# Altium integrated library Lattice CPLD ispLSI.IntLib: 471 symbols (part 10 of 26) (continued)
## ispLSI2128A-80LT176 (continued)
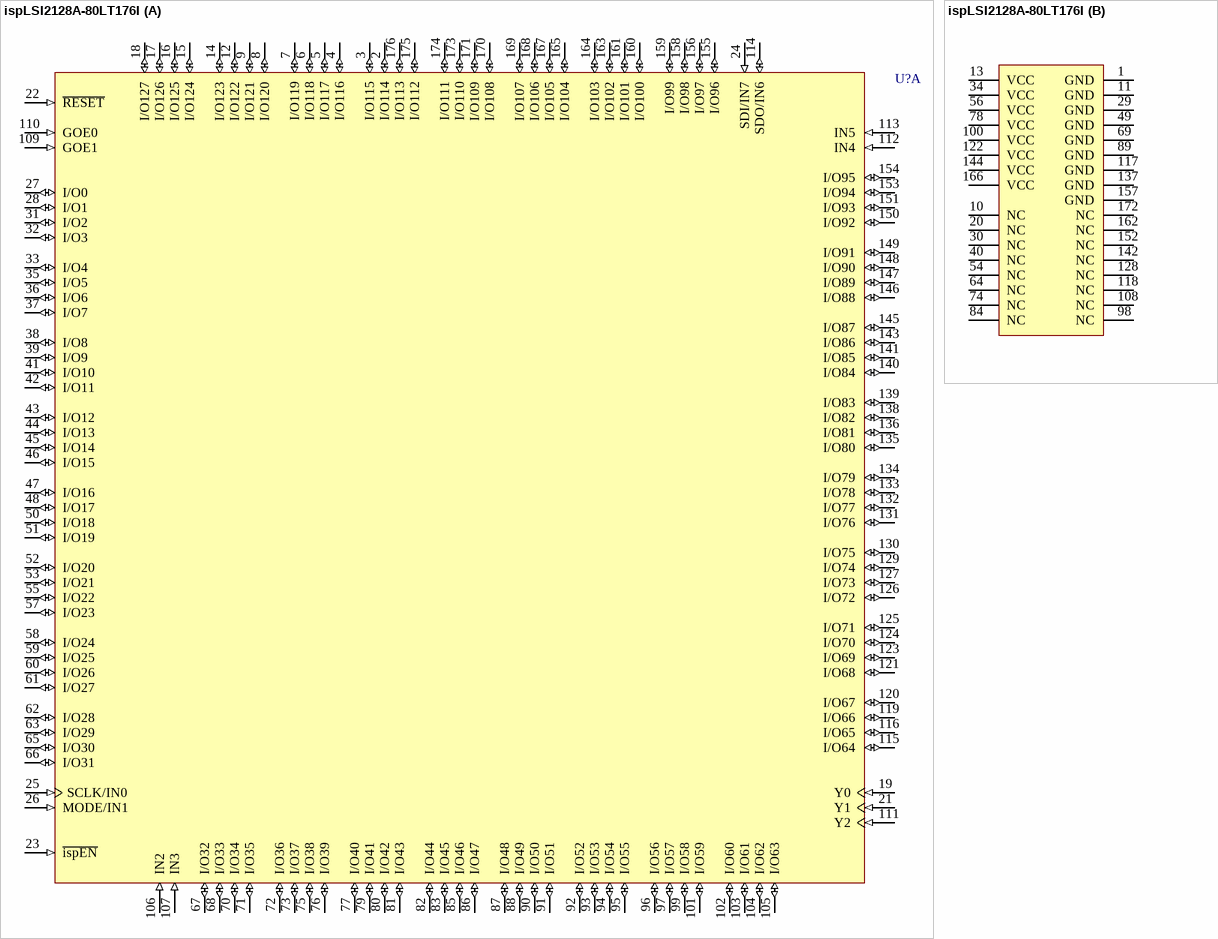
[diagram p82: symbol ispLSI2128A-80LT176I]

## ispLSI2128A-80LT176I
designator U?
In-System Programmable High-Density PLD; Note: Pins 24, 25, 26 and 114 have dual function capability.; Published: 23-Sep-2002; LatestRevisionDate: 13-Apr-2006; LatestRevisionNote: IPC-7351 Footprint Added.; DatasheetVersion: Apr-2000; PackageVersion: pkg_32, Aug-2005; PackageReference: TQFP176; Publisher: Altium Limited; PackageDescription: 176-Pin Thin Quad Flat Pack 0.5 mm Pitch; ComponentLink1Description: Manufacturer Link; ComponentLink1URL: http://www.latticesemi.com/products/mature/index.cfm; ComponentLink2Description: Datasheet; ComponentLink2URL: http://www.latticesemi.com/lit/docs/datasheets/cpld/2128.pdf
footprint TQFP176_N (Thin QFP, 176-Leads, Body 24x24mm, Pitch 0.5mm, IPC Medium Density)
footprint TQFP176_L (Thin QFP, 176-Leads, Body 24x24mm, Pitch 0.5mm, IPC High Density)
footprint TQFP176_M (Thin QFP, 176-Leads, Body 24x24mm, Pitch 0.5mm, IPC Low Density)
3D model 2128A-TQFP176 (176-Pin Thin Quad Flat Pack 0.5 mm Pitch)
part A pins: 2 I/O114 (io), 3 I/O115 (io), 4 I/O116 (io), 5 I/O117 (io), 6 I/O118 (io), 7 I/O119 (io), 8 I/O120 (io), 9 I/O121 (io), 12 I/O122 (io), 14 I/O123 (io), 15 I/O124 (io), 16 I/O125 (io), 17 I/O126 (io), 18 I/O127 (io), 19 Y0 (in), 21 Y1 (in), 22 ~{RESET} (in), 23 ~{ispEN} (in), 24 SDI/IN7 (in), 25 SCLK/IN0 (in), 26 MODE/IN1 (in), 27 I/O0 (io), 28 I/O1 (io), 31 I/O2 (io), 32 I/O3 (io), 33 I/O4 (io), 35 I/O5 (io), 36 I/O6 (io), 37 I/O7 (io), 38 I/O8 (io), 39 I/O9 (io), 41 I/O10 (io), 42 I/O11 (io), 43 I/O12 (io), 44 I/O13 (io), 45 I/O14 (io), 46 I/O15 (io), 47 I/O16 (io), 48 I/O17 (io), 50 I/O18 (io), 51 I/O19 (io), 52 I/O20 (io), 53 I/O21 (io), 55 I/O22 (io), 57 I/O23 (io), 58 I/O24 (io), 59 I/O25 (io), 60 I/O26 (io), 61 I/O27 (io), 62 I/O28 (io), 63 I/O29 (io), 65 I/O30 (io), 66 I/O31 (io), 67 I/O32 (io), 68 I/O33 (io), 70 I/O34 (io), 71 I/O35 (io), 72 I/O36 (io), 73 I/O37 (io), 75 I/O38 (io), 76 I/O39 (io), 77 I/O40 (io), 79 I/O41 (io), 80 I/O42 (io), 81 I/O43 (io), 82 I/O44 (io), 83 I/O45 (io), 85 I/O46 (io), 86 I/O47 (io), 87 I/O48 (io), 88 I/O49 (io), 90 I/O50 (io), 91 I/O51 (io), 92 I/O52 (io), 93 I/O53 (io), 94 I/O54 (io), 95 I/O55 (io), 96 I/O56 (io), 97 I/O57 (io), 99 I/O58 (io), 101 I/O59 (io), 102 I/O60 (io), 103 I/O61 (io), 104 I/O62 (io), 105 I/O63 (io), 106 IN2 (in), 107 IN3 (in), 109 GOE1 (in), 110 GOE0 (in), 111 Y2 (in), 112 IN4 (in), 113 IN5 (in), 114 SDO/IN6 (io), 115 I/O64 (io), 116 I/O65 (io), 119 I/O66 (io), 120 I/O67 (io), 121 I/O68 (io), 123 I/O69 (io), 124 I/O70 (io), 125 I/O71 (io), 126 I/O72 (io), 127 I/O73 (io), 129 I/O74 (io), 130 I/O75 (io), 131 I/O76 (io), 132 I/O77 (io), 133 I/O78 (io), 134 I/O79 (io), 135 I/O80 (io), 136 I/O81 (io), 138 I/O82 (io), 139 I/O83 (io), 140 I/O84 (io), 141 I/O85 (io), 143 I/O86 (io), 145 I/O87 (io), 146 I/O88 (io), 147 I/O89 (io), 148 I/O90 (io), 149 I/O91 (io), 150 I/O92 (io), 151 I/O93 (io), 153 I/O94 (io), 154 I/O95 (io), 155 I/O96 (io), 156 I/O97 (io), 158 I/O98 (io), 159 I/O99 (io), 160 I/O100 (io), 161 I/O101 (io), 163 I/O102 (io), 164 I/O103 (io), 165 I/O104 (io), 167 I/O105 (io), 168 I/O106 (io), 169 I/O107 (io), 170 I/O108 (io), 171 I/O109 (io), 173 I/O110 (io), 174 I/O111 (io), 175 I/O112 (io), 176 I/O113 (io)
part B pins: 1 GND (power), 10 NC, 11 GND (power), 13 VCC (power), 20 NC, 29 GND (power), 30 NC, 34 VCC (power), 40 NC, 49 GND (power), 54 NC, 56 VCC (power), 64 NC, 69 GND (power), 74 NC, 78 VCC (power), 84 NC, 89 GND (power), 98 NC, 100 VCC (power), 108 NC, 117 GND (power), 118 NC, 122 VCC (power), 128 NC, 137 GND (power), 142 NC, 144 VCC (power), 152 NC, 157 GND (power), 162 NC, 166 VCC (power), 172 NC

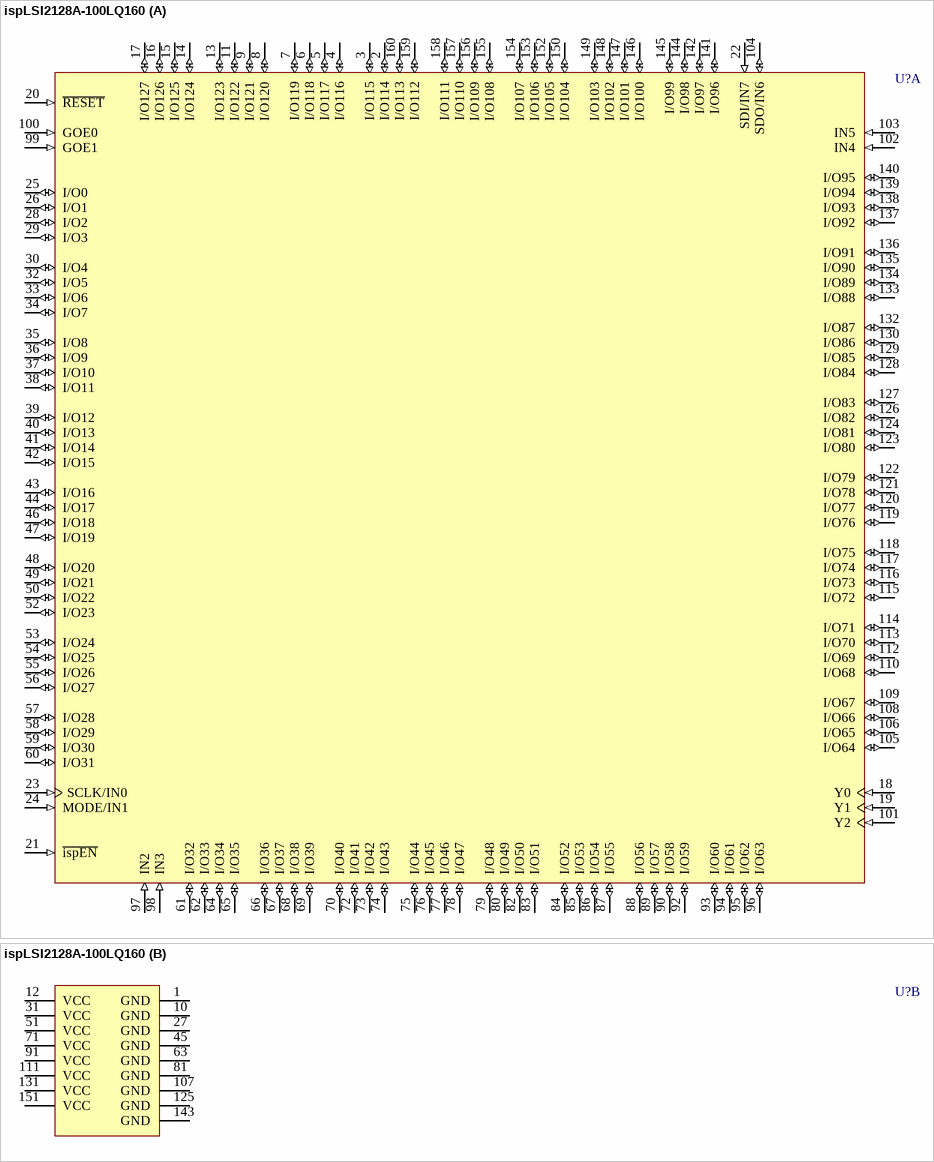
[diagram p83: symbol ispLSI2128A-100LQ160]

## ispLSI2128A-100LQ160
designator U?
In-System Programmable High-Density PLD; Note: Pins 22, 23, 24 and 104 have dual function capability.; Published: 23-Sep-2002; LatestRevisionDate: 13-Apr-2006; LatestRevisionNote: IPC-7351 Footprint Added.; DatasheetVersion: Apr-2000; PackageVersion: pkg_32, Aug-2005; PackageReference: PQFP160; Publisher: Altium Limited; PackageDescription: 160-Pin Quad Flat Pack 0.65 mm Pitch; Code_IPC: QFP65P3120X3120-160; ComponentLink1Description: Manufacturer Link; ComponentLink1URL: http://www.latticesemi.com/products/mature/index.cfm; ComponentLink2Description: Datasheet; ComponentLink2URL: http://www.latticesemi.com/lit/docs/datasheets/cpld/2128.pdf
footprint PQFP160_N (QFP, 160-Leads, Body 28 x 28mm, Pitch 0.65mm, IPC Medium Density)
footprint PQFP160_L (QFP, 160-Leads, Body 28 x 28mm, Pitch 0.65mm, IPC High Density)
footprint PQFP160_M (QFP, 160-Leads, Body 28 x 28mm, Pitch 0.65mm, IPC Low Density)
3D model 2128A-PQFP160 (160-Pin Quad Flat Pack 0.65 mm Pitch)
part A pins: 2 I/O114 (io), 3 I/O115 (io), 4 I/O116 (io), 5 I/O117 (io), 6 I/O118 (io), 7 I/O119 (io), 8 I/O120 (io), 9 I/O121 (io), 11 I/O122 (io), 13 I/O123 (io), 14 I/O124 (io), 15 I/O125 (io), 16 I/O126 (io), 17 I/O127 (io), 18 Y0 (in), 19 Y1 (in), 20 ~{RESET} (in), 21 ~{ispEN} (in), 22 SDI/IN7 (in), 23 SCLK/IN0 (in), 24 MODE/IN1 (in), 25 I/O0 (io), 26 I/O1 (io), 28 I/O2 (io), 29 I/O3 (io), 30 I/O4 (io), 32 I/O5 (io), 33 I/O6 (io), 34 I/O7 (io), 35 I/O8 (io), 36 I/O9 (io), 37 I/O10 (io), 38 I/O11 (io), 39 I/O12 (io), 40 I/O13 (io), 41 I/O14 (io), 42 I/O15 (io), 43 I/O16 (io), 44 I/O17 (io), 46 I/O18 (io), 47 I/O19 (io), 48 I/O20 (io), 49 I/O21 (io), 50 I/O22 (io), 52 I/O23 (io), 53 I/O24 (io), 54 I/O25 (io), 55 I/O26 (io), 56 I/O27 (io), 57 I/O28 (io), 58 I/O29 (io), 59 I/O30 (io), 60 I/O31 (io), 61 I/O32 (io), 62 I/O33 (io), 64 I/O34 (io), 65 I/O35 (io), 66 I/O36 (io), 67 I/O37 (io), 68 I/O38 (io), 69 I/O39 (io), 70 I/O40 (io), 72 I/O41 (io), 73 I/O42 (io), 74 I/O43 (io), 75 I/O44 (io), 76 I/O45 (io), 77 I/O46 (io), 78 I/O47 (io), 79 I/O48 (io), 80 I/O49 (io), 82 I/O50 (io), 83 I/O51 (io), 84 I/O52 (io), 85 I/O53 (io), 86 I/O54 (io), 87 I/O55 (io), 88 I/O56 (io), 89 I/O57 (io), 90 I/O58 (io), 92 I/O59 (io), 93 I/O60 (io), 94 I/O61 (io), 95 I/O62 (io), 96 I/O63 (io), 97 IN2 (in), 98 IN3 (in), 99 GOE1 (in), 100 GOE0 (in), 101 Y2 (in), 102 IN4 (in), 103 IN5 (in), 104 SDO/IN6 (io), 105 I/O64 (io), 106 I/O65 (io), 108 I/O66 (io), 109 I/O67 (io), 110 I/O68 (io), 112 I/O69 (io), 113 I/O70 (io), 114 I/O71 (io), 115 I/O72 (io), 116 I/O73 (io), 117 I/O74 (io), 118 I/O75 (io), 119 I/O76 (io), 120 I/O77 (io), 121 I/O78 (io), 122 I/O79 (io), 123 I/O80 (io), 124 I/O81 (io), 126 I/O82 (io), 127 I/O83 (io), 128 I/O84 (io), 129 I/O85 (io), 130 I/O86 (io), 132 I/O87 (io), 133 I/O88 (io), 134 I/O89 (io), 135 I/O90 (io), 136 I/O91 (io), 137 I/O92 (io), 138 I/O93 (io), 139 I/O94 (io), 140 I/O95 (io), 141 I/O96 (io), 142 I/O97 (io), 144 I/O98 (io), 145 I/O99 (io), 146 I/O100 (io), 147 I/O101 (io), 148 I/O102 (io), 149 I/O103 (io), 150 I/O104 (io), 152 I/O105 (io), 153 I/O106 (io), 154 I/O107 (io), 155 I/O108 (io), 156 I/O109 (io), 157 I/O110 (io), 158 I/O111 (io), 159 I/O112 (io), 160 I/O113 (io)
part B pins: 1 GND (power), 10 GND (power), 12 VCC (power), 27 GND (power), 31 VCC (power), 45 GND (power), 51 VCC (power), 63 GND (power), 71 VCC (power), 81 GND (power), 91 VCC (power), 107 GND (power), 111 VCC (power), 125 GND (power), 131 VCC (power), 143 GND (power), 151 VCC (power)

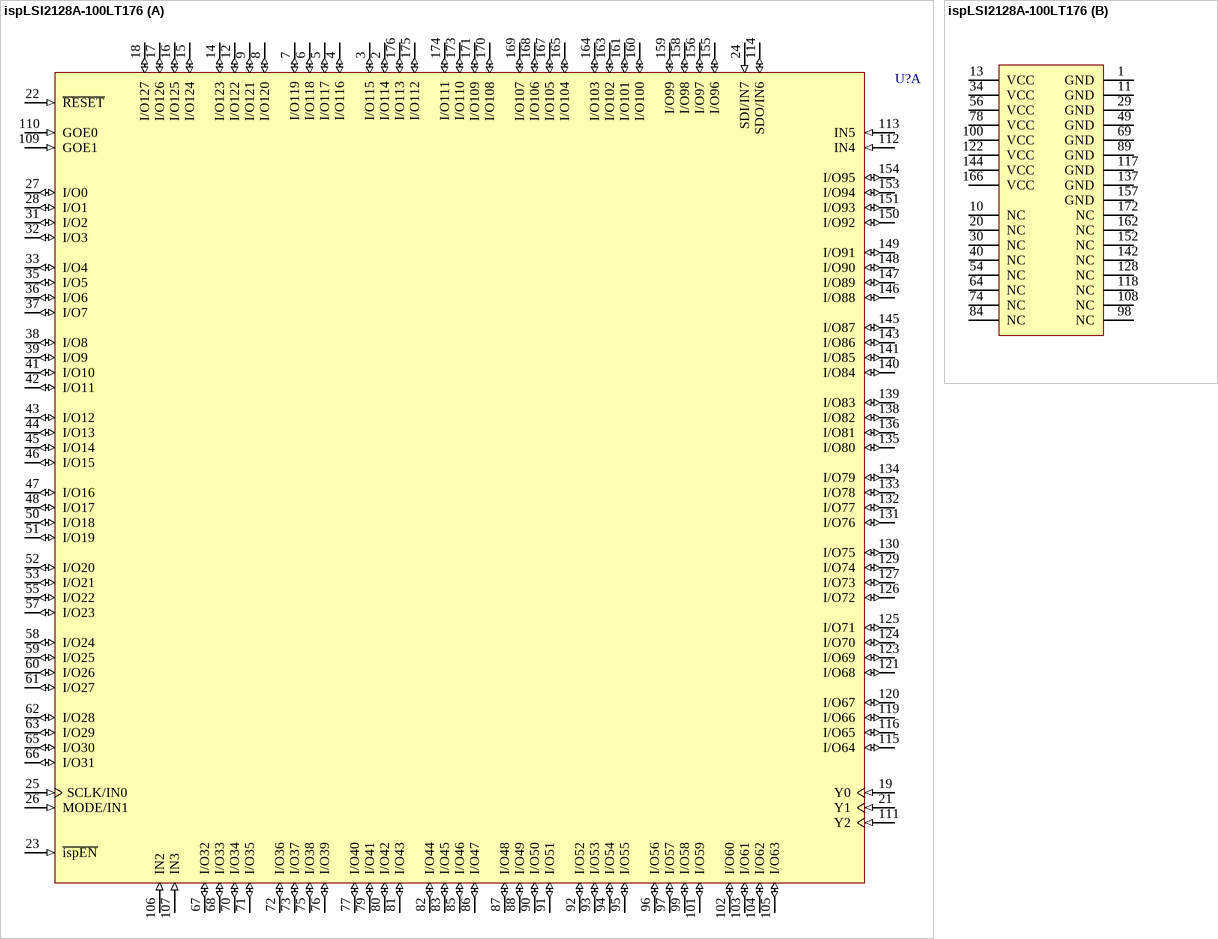
[diagram p84: symbol ispLSI2128A-100LT176]

## ispLSI2128A-100LT176
designator U?
In-System Programmable High-Density PLD; Note: Pins 24, 25, 26 and 114 have dual function capability.; Published: 23-Sep-2002; LatestRevisionDate: 13-Apr-2006; LatestRevisionNote: IPC-7351 Footprint Added.; DatasheetVersion: Apr-2000; PackageVersion: pkg_32, Aug-2005; PackageReference: TQFP176; Publisher: Altium Limited; PackageDescription: 176-Pin Thin Quad Flat Pack 0.5 mm Pitch; ComponentLink1Description: Manufacturer Link; ComponentLink1URL: http://www.latticesemi.com/products/mature/index.cfm; ComponentLink2Description: Datasheet; ComponentLink2URL: http://www.latticesemi.com/lit/docs/datasheets/cpld/2128.pdf
footprint TQFP176_N (Thin QFP, 176-Leads, Body 24x24mm, Pitch 0.5mm, IPC Medium Density)
footprint TQFP176_L (Thin QFP, 176-Leads, Body 24x24mm, Pitch 0.5mm, IPC High Density)
footprint TQFP176_M (Thin QFP, 176-Leads, Body 24x24mm, Pitch 0.5mm, IPC Low Density)
3D model 2128A-TQFP176 (176-Pin Thin Quad Flat Pack 0.5 mm Pitch)
part A pins: 2 I/O114 (io), 3 I/O115 (io), 4 I/O116 (io), 5 I/O117 (io), 6 I/O118 (io), 7 I/O119 (io), 8 I/O120 (io), 9 I/O121 (io), 12 I/O122 (io), 14 I/O123 (io), 15 I/O124 (io), 16 I/O125 (io), 17 I/O126 (io), 18 I/O127 (io), 19 Y0 (in), 21 Y1 (in), 22 ~{RESET} (in), 23 ~{ispEN} (in), 24 SDI/IN7 (in), 25 SCLK/IN0 (in), 26 MODE/IN1 (in), 27 I/O0 (io), 28 I/O1 (io), 31 I/O2 (io), 32 I/O3 (io), 33 I/O4 (io), 35 I/O5 (io), 36 I/O6 (io), 37 I/O7 (io), 38 I/O8 (io), 39 I/O9 (io), 41 I/O10 (io), 42 I/O11 (io), 43 I/O12 (io), 44 I/O13 (io), 45 I/O14 (io), 46 I/O15 (io), 47 I/O16 (io), 48 I/O17 (io), 50 I/O18 (io), 51 I/O19 (io), 52 I/O20 (io), 53 I/O21 (io), 55 I/O22 (io), 57 I/O23 (io), 58 I/O24 (io), 59 I/O25 (io), 60 I/O26 (io), 61 I/O27 (io), 62 I/O28 (io), 63 I/O29 (io), 65 I/O30 (io), 66 I/O31 (io), 67 I/O32 (io), 68 I/O33 (io), 70 I/O34 (io), 71 I/O35 (io), 72 I/O36 (io), 73 I/O37 (io), 75 I/O38 (io), 76 I/O39 (io), 77 I/O40 (io), 79 I/O41 (io), 80 I/O42 (io), 81 I/O43 (io), 82 I/O44 (io), 83 I/O45 (io), 85 I/O46 (io), 86 I/O47 (io), 87 I/O48 (io), 88 I/O49 (io), 90 I/O50 (io), 91 I/O51 (io), 92 I/O52 (io), 93 I/O53 (io), 94 I/O54 (io), 95 I/O55 (io), 96 I/O56 (io), 97 I/O57 (io), 99 I/O58 (io), 101 I/O59 (io), 102 I/O60 (io), 103 I/O61 (io), 104 I/O62 (io), 105 I/O63 (io), 106 IN2 (in), 107 IN3 (in), 109 GOE1 (in), 110 GOE0 (in), 111 Y2 (in), 112 IN4 (in), 113 IN5 (in), 114 SDO/IN6 (io), 115 I/O64 (io), 116 I/O65 (io), 119 I/O66 (io), 120 I/O67 (io), 121 I/O68 (io), 123 I/O69 (io), 124 I/O70 (io), 125 I/O71 (io), 126 I/O72 (io), 127 I/O73 (io), 129 I/O74 (io), 130 I/O75 (io), 131 I/O76 (io), 132 I/O77 (io), 133 I/O78 (io), 134 I/O79 (io), 135 I/O80 (io), 136 I/O81 (io), 138 I/O82 (io), 139 I/O83 (io), 140 I/O84 (io), 141 I/O85 (io), 143 I/O86 (io), 145 I/O87 (io), 146 I/O88 (io), 147 I/O89 (io), 148 I/O90 (io), 149 I/O91 (io), 150 I/O92 (io), 151 I/O93 (io), 153 I/O94 (io), 154 I/O95 (io), 155 I/O96 (io), 156 I/O97 (io), 158 I/O98 (io), 159 I/O99 (io), 160 I/O100 (io), 161 I/O101 (io), 163 I/O102 (io), 164 I/O103 (io), 165 I/O104 (io), 167 I/O105 (io), 168 I/O106 (io), 169 I/O107 (io), 170 I/O108 (io), 171 I/O109 (io), 173 I/O110 (io), 174 I/O111 (io), 175 I/O112 (io), 176 I/O113 (io)
part B pins: 1 GND (power), 10 NC, 11 GND (power), 13 VCC (power), 20 NC, 29 GND (power), 30 NC, 34 VCC (power), 40 NC, 49 GND (power), 54 NC, 56 VCC (power), 64 NC, 69 GND (power), 74 NC, 78 VCC (power), 84 NC, 89 GND (power), 98 NC, 100 VCC (power), 108 NC, 117 GND (power), 118 NC, 122 VCC (power), 128 NC, 137 GND (power), 142 NC, 144 VCC (power), 152 NC, 157 GND (power), 162 NC, 166 VCC (power), 172 NC

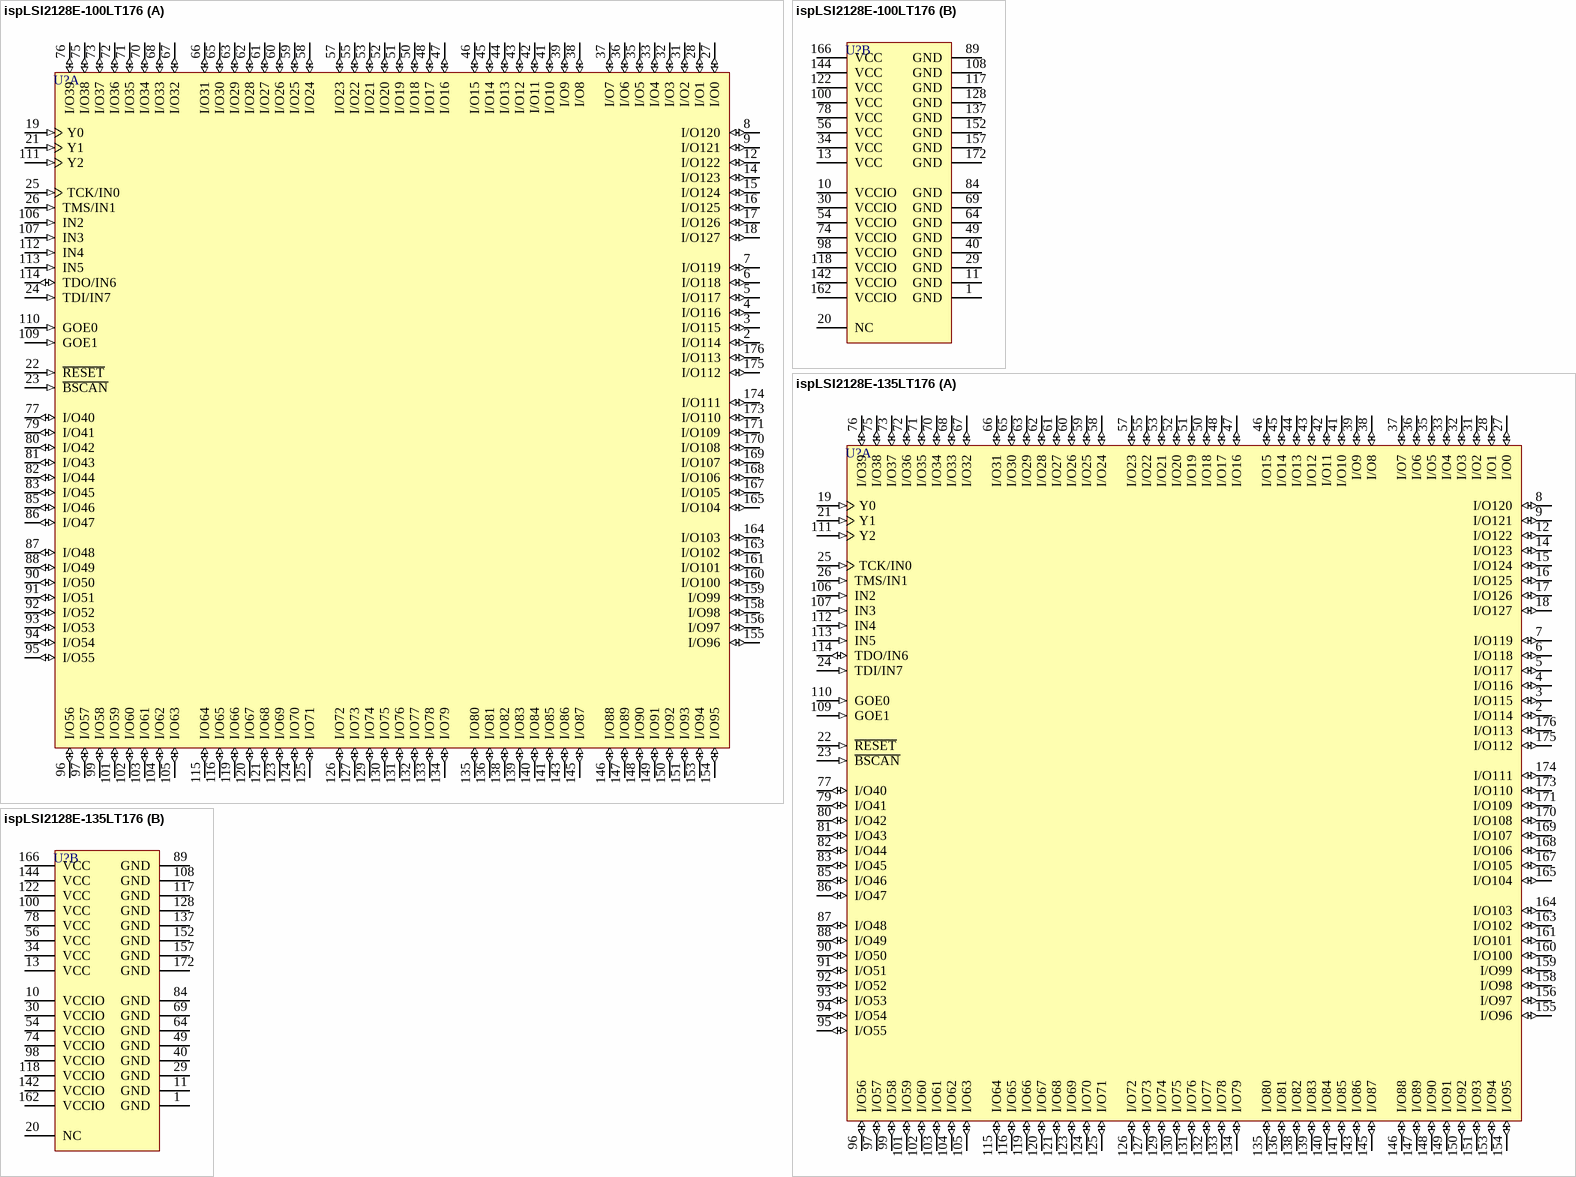
[diagram p85: symbols ispLSI2128E-100LT176 to ispLSI2128E-135LT176]

## ispLSI2128E-100LT176
designator U?
In-System Programmable SuperFAST High Density PLD; Published: 17-Jul-2002; LatestRevisionDate: 13-Apr-2006; LatestRevisionNote: IPC-7351 Footprint Added.; DatasheetVersion: Nov-1998; PackageVersion: pkg_32, Aug-2005; PackageReference: TQFP176; Publisher: Altium Limited; PackageDescription: 176-Pin Thin Quad Flat Pack 0.5 mm Pitch; ComponentLink1Description: Manufacturer Link; ComponentLink1URL: http://www.latticesemi.com/products/mature/index.cfm; ComponentLink2Description: Datasheet; ComponentLink2URL: http://www.latticesemi.com/lit/docs/datasheets/cpld/2128e.pdf
footprint TQFP176_N (Thin QFP, 176-Leads, Body 24x24mm, Pitch 0.5mm, IPC Medium Density)
footprint TQFP176_L (Thin QFP, 176-Leads, Body 24x24mm, Pitch 0.5mm, IPC High Density)
footprint TQFP176_M (Thin QFP, 176-Leads, Body 24x24mm, Pitch 0.5mm, IPC Low Density)
3D model 2128E-TQFP176 (176-Pin Thin Quad Flat Pack 0.5 mm Pitch)
part A pins: 2 I/O114 (io), 3 I/O115 (io), 4 I/O116 (io), 5 I/O117 (io), 6 I/O118 (io), 7 I/O119 (io), 8 I/O120 (io), 9 I/O121 (io), 12 I/O122 (io), 14 I/O123 (io), 15 I/O124 (io), 16 I/O125 (io), 17 I/O126 (io), 18 I/O127 (io), 19 Y0 (in), 21 Y1 (in), 22 ~{RESET} (in), 23 ~{BSCAN} (in), 24 TDI/IN7 (in), 25 TCK/IN0 (in), 26 TMS/IN1 (in), 27 I/O0 (io), 28 I/O1 (io), 31 I/O2 (io), 32 I/O3 (io), 33 I/O4 (io), 35 I/O5 (io), 36 I/O6 (io), 37 I/O7 (io), 38 I/O8 (io), 39 I/O9 (io), 41 I/O10 (io), 42 I/O11 (io), 43 I/O12 (io), 44 I/O13 (io), 45 I/O14 (io), 46 I/O15 (io), 47 I/O16 (io), 48 I/O17 (io), 50 I/O18 (io), 51 I/O19 (io), 52 I/O20 (io), 53 I/O21 (io), 55 I/O22 (io), 57 I/O23 (io), 58 I/O24 (io), 59 I/O25 (io), 60 I/O26 (io), 61 I/O27 (io), 62 I/O28 (io), 63 I/O29 (io), 65 I/O30 (io), 66 I/O31 (io), 67 I/O32 (io), 68 I/O33 (io), 70 I/O34 (io), 71 I/O35 (io), 72 I/O36 (io), 73 I/O37 (io), 75 I/O38 (io), 76 I/O39 (io), 77 I/O40 (io), 79 I/O41 (io), 80 I/O42 (io), 81 I/O43 (io), 82 I/O44 (io), 83 I/O45 (io), 85 I/O46 (io), 86 I/O47 (io), 87 I/O48 (io), 88 I/O49 (io), 90 I/O50 (io), 91 I/O51 (io), 92 I/O52 (io), 93 I/O53 (io), 94 I/O54 (io), 95 I/O55 (io), 96 I/O56 (io), 97 I/O57 (io), 99 I/O58 (io), 101 I/O59 (io), 102 I/O60 (io), 103 I/O61 (io), 104 I/O62 (io), 105 I/O63 (io), 106 IN2 (in), 107 IN3 (in), 109 GOE1 (in), 110 GOE0 (in), 111 Y2 (in), 112 IN4 (in), 113 IN5 (in), 114 TDO/IN6 (io), 115 I/O64 (io), 116 I/O65 (io), 119 I/O66 (io), 120 I/O67 (io), 121 I/O68 (io), 123 I/O69 (io), 124 I/O70 (io), 125 I/O71 (io), 126 I/O72 (io), 127 I/O73 (io), 129 I/O74 (io), 130 I/O75 (io), 131 I/O76 (io), 132 I/O77 (io), 133 I/O78 (io), 134 I/O79 (io), 135 I/O80 (io), 136 I/O81 (io), 138 I/O82 (io), 139 I/O83 (io), 140 I/O84 (io), 141 I/O85 (io), 143 I/O86 (io), 145 I/O87 (io), 146 I/O88 (io), 147 I/O89 (io), 148 I/O90 (io), 149 I/O91 (io), 150 I/O92 (io), 151 I/O93 (io), 153 I/O94 (io), 154 I/O95 (io), 155 I/O96 (io), 156 I/O97 (io), 158 I/O98 (io), 159 I/O99 (io), 160 I/O100 (io), 161 I/O101 (io), 163 I/O102 (io), 164 I/O103 (io), 165 I/O104 (io), 167 I/O105 (io), 168 I/O106 (io), 169 I/O107 (io), 170 I/O108 (io), 171 I/O109 (io), 173 I/O110 (io), 174 I/O111 (io), 175 I/O112 (io), 176 I/O113 (io)
part B pins: 1 GND (power), 10 VCCIO (power), 11 GND (power), 13 VCC (power), 20 NC, 29 GND (power), 30 VCCIO (power), 34 VCC (power), 40 GND (power), 49 GND (power), 54 VCCIO (power), 56 VCC (power), 64 GND (power), 69 GND (power), 74 VCCIO (power), 78 VCC (power), 84 GND (power), 89 GND (power), 98 VCCIO (power), 100 VCC (power), 108 GND (power), 117 GND (power), 118 VCCIO (power), 122 VCC (power), 128 GND (power), 137 GND (power), 142 VCCIO (power), 144 VCC (power), 152 GND (power), 157 GND (power), 162 VCCIO (power), 166 VCC (power), 172 GND (power)

## ispLSI2128E-135LT176
designator U?
In-System Programmable SuperFAST High Density PLD; Published: 17-Jul-2002; LatestRevisionDate: 13-Apr-2006; LatestRevisionNote: IPC-7351 Footprint Added.; DatasheetVersion: Nov-1998; PackageVersion: pkg_32, Aug-2005; PackageReference: TQFP176; Publisher: Altium Limited; PackageDescription: 176-Pin Thin Quad Flat Pack 0.5 mm Pitch; ComponentLink1Description: Manufacturer Link; ComponentLink1URL: http://www.latticesemi.com/products/mature/index.cfm; ComponentLink2Description: Datasheet; ComponentLink2URL: http://www.latticesemi.com/lit/docs/datasheets/cpld/2128e.pdf
footprint TQFP176_N (Thin QFP, 176-Leads, Body 24x24mm, Pitch 0.5mm, IPC Medium Density)
footprint TQFP176_L (Thin QFP, 176-Leads, Body 24x24mm, Pitch 0.5mm, IPC High Density)
footprint TQFP176_M (Thin QFP, 176-Leads, Body 24x24mm, Pitch 0.5mm, IPC Low Density)
3D model 2128E-TQFP176 (176-Pin Thin Quad Flat Pack 0.5 mm Pitch)
part A pins: 2 I/O114 (io), 3 I/O115 (io), 4 I/O116 (io), 5 I/O117 (io), 6 I/O118 (io), 7 I/O119 (io), 8 I/O120 (io), 9 I/O121 (io), 12 I/O122 (io), 14 I/O123 (io), 15 I/O124 (io), 16 I/O125 (io), 17 I/O126 (io), 18 I/O127 (io), 19 Y0 (in), 21 Y1 (in), 22 ~{RESET} (in), 23 ~{BSCAN} (in), 24 TDI/IN7 (in), 25 TCK/IN0 (in), 26 TMS/IN1 (in), 27 I/O0 (io), 28 I/O1 (io), 31 I/O2 (io), 32 I/O3 (io), 33 I/O4 (io), 35 I/O5 (io), 36 I/O6 (io), 37 I/O7 (io), 38 I/O8 (io), 39 I/O9 (io), 41 I/O10 (io), 42 I/O11 (io), 43 I/O12 (io), 44 I/O13 (io), 45 I/O14 (io), 46 I/O15 (io), 47 I/O16 (io), 48 I/O17 (io), 50 I/O18 (io), 51 I/O19 (io), 52 I/O20 (io), 53 I/O21 (io), 55 I/O22 (io), 57 I/O23 (io), 58 I/O24 (io), 59 I/O25 (io), 60 I/O26 (io), 61 I/O27 (io), 62 I/O28 (io), 63 I/O29 (io), 65 I/O30 (io), 66 I/O31 (io), 67 I/O32 (io), 68 I/O33 (io), 70 I/O34 (io), 71 I/O35 (io), 72 I/O36 (io), 73 I/O37 (io), 75 I/O38 (io), 76 I/O39 (io), 77 I/O40 (io), 79 I/O41 (io), 80 I/O42 (io), 81 I/O43 (io), 82 I/O44 (io), 83 I/O45 (io), 85 I/O46 (io), 86 I/O47 (io), 87 I/O48 (io), 88 I/O49 (io), 90 I/O50 (io), 91 I/O51 (io), 92 I/O52 (io), 93 I/O53 (io), 94 I/O54 (io), 95 I/O55 (io), 96 I/O56 (io), 97 I/O57 (io), 99 I/O58 (io), 101 I/O59 (io), 102 I/O60 (io), 103 I/O61 (io), 104 I/O62 (io), 105 I/O63 (io), 106 IN2 (in), 107 IN3 (in), 109 GOE1 (in), 110 GOE0 (in), 111 Y2 (in), 112 IN4 (in), 113 IN5 (in), 114 TDO/IN6 (io), 115 I/O64 (io), 116 I/O65 (io), 119 I/O66 (io), 120 I/O67 (io), 121 I/O68 (io), 123 I/O69 (io), 124 I/O70 (io), 125 I/O71 (io), 126 I/O72 (io), 127 I/O73 (io), 129 I/O74 (io), 130 I/O75 (io), 131 I/O76 (io), 132 I/O77 (io), 133 I/O78 (io), 134 I/O79 (io), 135 I/O80 (io), 136 I/O81 (io), 138 I/O82 (io), 139 I/O83 (io), 140 I/O84 (io), 141 I/O85 (io), 143 I/O86 (io), 145 I/O87 (io), 146 I/O88 (io), 147 I/O89 (io), 148 I/O90 (io), 149 I/O91 (io), 150 I/O92 (io), 151 I/O93 (io), 153 I/O94 (io), 154 I/O95 (io), 155 I/O96 (io), 156 I/O97 (io), 158 I/O98 (io), 159 I/O99 (io), 160 I/O100 (io), 161 I/O101 (io), 163 I/O102 (io), 164 I/O103 (io), 165 I/O104 (io), 167 I/O105 (io), 168 I/O106 (io), 169 I/O107 (io), 170 I/O108 (io), 171 I/O109 (io), 173 I/O110 (io), 174 I/O111 (io), 175 I/O112 (io), 176 I/O113 (io)
part B pins: 1 GND (power), 10 VCCIO (power), 11 GND (power), 13 VCC (power), 20 NC, 29 GND (power), 30 VCCIO (power), 34 VCC (power), 40 GND (power), 49 GND (power), 54 VCCIO (power), 56 VCC (power), 64 GND (power), 69 GND (power), 74 VCCIO (power), 78 VCC (power), 84 GND (power), 89 GND (power), 98 VCCIO (power), 100 VCC (power), 108 GND (power), 117 GND (power), 118 VCCIO (power), 122 VCC (power), 128 GND (power), 137 GND (power), 142 VCCIO (power), 144 VCC (power), 152 GND (power), 157 GND (power), 162 VCCIO (power), 166 VCC (power), 172 GND (power)

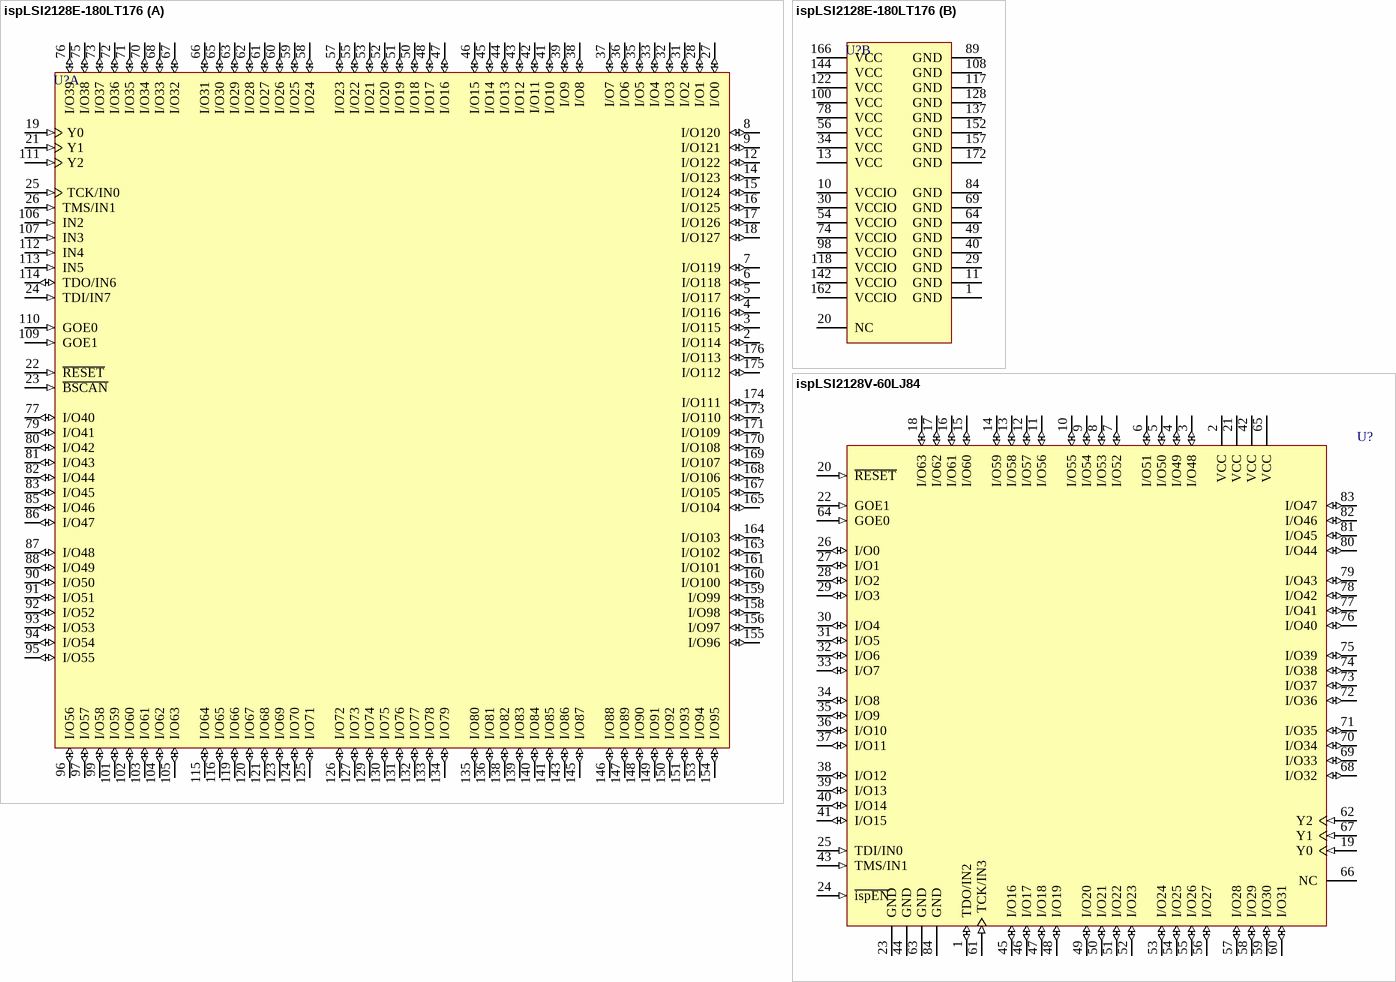
[diagram p86: symbols ispLSI2128E-180LT176 to ispLSI2128V-60LJ84]

## ispLSI2128E-180LT176
designator U?
In-System Programmable SuperFAST High Density PLD; Published: 17-Jul-2002; LatestRevisionDate: 13-Apr-2006; LatestRevisionNote: IPC-7351 Footprint Added.; DatasheetVersion: Nov-1998; PackageVersion: pkg_32, Aug-2005; PackageReference: TQFP176; Publisher: Altium Limited; PackageDescription: 176-Pin Thin Quad Flat Pack 0.5 mm Pitch; ComponentLink1Description: Manufacturer Link; ComponentLink1URL: http://www.latticesemi.com/products/mature/index.cfm; ComponentLink2Description: Datasheet; ComponentLink2URL: http://www.latticesemi.com/lit/docs/datasheets/cpld/2128e.pdf
footprint TQFP176_N (Thin QFP, 176-Leads, Body 24x24mm, Pitch 0.5mm, IPC Medium Density)
footprint TQFP176_L (Thin QFP, 176-Leads, Body 24x24mm, Pitch 0.5mm, IPC High Density)
footprint TQFP176_M (Thin QFP, 176-Leads, Body 24x24mm, Pitch 0.5mm, IPC Low Density)
3D model 2128E-TQFP176 (176-Pin Thin Quad Flat Pack 0.5 mm Pitch)
part A pins: 2 I/O114 (io), 3 I/O115 (io), 4 I/O116 (io), 5 I/O117 (io), 6 I/O118 (io), 7 I/O119 (io), 8 I/O120 (io), 9 I/O121 (io), 12 I/O122 (io), 14 I/O123 (io), 15 I/O124 (io), 16 I/O125 (io), 17 I/O126 (io), 18 I/O127 (io), 19 Y0 (in), 21 Y1 (in), 22 ~{RESET} (in), 23 ~{BSCAN} (in), 24 TDI/IN7 (in), 25 TCK/IN0 (in), 26 TMS/IN1 (in), 27 I/O0 (io), 28 I/O1 (io), 31 I/O2 (io), 32 I/O3 (io), 33 I/O4 (io), 35 I/O5 (io), 36 I/O6 (io), 37 I/O7 (io), 38 I/O8 (io), 39 I/O9 (io), 41 I/O10 (io), 42 I/O11 (io), 43 I/O12 (io), 44 I/O13 (io), 45 I/O14 (io), 46 I/O15 (io), 47 I/O16 (io), 48 I/O17 (io), 50 I/O18 (io), 51 I/O19 (io), 52 I/O20 (io), 53 I/O21 (io), 55 I/O22 (io), 57 I/O23 (io), 58 I/O24 (io), 59 I/O25 (io), 60 I/O26 (io), 61 I/O27 (io), 62 I/O28 (io), 63 I/O29 (io), 65 I/O30 (io), 66 I/O31 (io), 67 I/O32 (io), 68 I/O33 (io), 70 I/O34 (io), 71 I/O35 (io), 72 I/O36 (io), 73 I/O37 (io), 75 I/O38 (io), 76 I/O39 (io), 77 I/O40 (io), 79 I/O41 (io), 80 I/O42 (io), 81 I/O43 (io), 82 I/O44 (io), 83 I/O45 (io), 85 I/O46 (io), 86 I/O47 (io), 87 I/O48 (io), 88 I/O49 (io), 90 I/O50 (io), 91 I/O51 (io), 92 I/O52 (io), 93 I/O53 (io), 94 I/O54 (io), 95 I/O55 (io), 96 I/O56 (io), 97 I/O57 (io), 99 I/O58 (io), 101 I/O59 (io), 102 I/O60 (io), 103 I/O61 (io), 104 I/O62 (io), 105 I/O63 (io), 106 IN2 (in), 107 IN3 (in), 109 GOE1 (in), 110 GOE0 (in), 111 Y2 (in), 112 IN4 (in), 113 IN5 (in), 114 TDO/IN6 (io), 115 I/O64 (io), 116 I/O65 (io), 119 I/O66 (io), 120 I/O67 (io), 121 I/O68 (io), 123 I/O69 (io), 124 I/O70 (io), 125 I/O71 (io), 126 I/O72 (io), 127 I/O73 (io), 129 I/O74 (io), 130 I/O75 (io), 131 I/O76 (io), 132 I/O77 (io), 133 I/O78 (io), 134 I/O79 (io), 135 I/O80 (io), 136 I/O81 (io), 138 I/O82 (io), 139 I/O83 (io), 140 I/O84 (io), 141 I/O85 (io), 143 I/O86 (io), 145 I/O87 (io), 146 I/O88 (io), 147 I/O89 (io), 148 I/O90 (io), 149 I/O91 (io), 150 I/O92 (io), 151 I/O93 (io), 153 I/O94 (io), 154 I/O95 (io), 155 I/O96 (io), 156 I/O97 (io), 158 I/O98 (io), 159 I/O99 (io), 160 I/O100 (io), 161 I/O101 (io), 163 I/O102 (io), 164 I/O103 (io), 165 I/O104 (io), 167 I/O105 (io), 168 I/O106 (io), 169 I/O107 (io), 170 I/O108 (io), 171 I/O109 (io), 173 I/O110 (io), 174 I/O111 (io), 175 I/O112 (io), 176 I/O113 (io)
part B pins: 1 GND (power), 10 VCCIO (power), 11 GND (power), 13 VCC (power), 20 NC, 29 GND (power), 30 VCCIO (power), 34 VCC (power), 40 GND (power), 49 GND (power), 54 VCCIO (power), 56 VCC (power), 64 GND (power), 69 GND (power), 74 VCCIO (power), 78 VCC (power), 84 GND (power), 89 GND (power), 98 VCCIO (power), 100 VCC (power), 108 GND (power), 117 GND (power), 118 VCCIO (power), 122 VCC (power), 128 GND (power), 137 GND (power), 142 VCCIO (power), 144 VCC (power), 152 GND (power), 157 GND (power), 162 VCCIO (power), 166 VCC (power), 172 GND (power)

## ispLSI2128V-60LJ84
designator U?
3.3V High-Density Programmable Logic; Published: 23-Sep-2002; LatestRevisionDate: 13-Apr-2006; LatestRevisionNote: IPC-7351 Footprint Added.; DatasheetVersion: Feb-2000; PackageVersion: pkg_32, Aug-2005; PackageReference: PLCC84; Publisher: Altium Limited; PackageDescription: 84-Pin Leaded Chip Carrier 1.27 mm Pitch; Code_IPC: PLCC-84; ComponentLink1Description: Manufacturer Link; ComponentLink1URL: http://www.latticesemi.com/products/mature/index.cfm; ComponentLink2Description: Datasheet; ComponentLink2URL: http://www.latticesemi.com/lit/docs/datasheets/cpld/2128v.pdf
footprint PLCC84_N (Leaded Chip Carrier, 84-Leads, Body 29.3x29.3mm, Pitch 1.27mm, IPC Medium Density)
footprint PLCC84_L (Leaded Chip Carrier, 84-Leads, Body 29.3x29.3mm, Pitch 1.27mm, IPC High Density)
footprint PLCC84_M (Leaded Chip Carrier, 84-Leads, Body 29.3x29.3mm, Pitch 1.27mm, IPC Low Density)
3D model 2128V-PLCC84 (84-Pin Leaded Chip Carrier 1.27 mm Pitch)
pins: 1 TDO/IN2 (io), 2 VCC (power), 3 I/O48 (io), 4 I/O49 (io), 5 I/O50 (io), 6 I/O51 (io), 7 I/O52 (io), 8 I/O53 (io), 9 I/O54 (io), 10 I/O55 (io), 11 I/O56 (io), 12 I/O57 (io), 13 I/O58 (io), 14 I/O59 (io), 15 I/O60 (io), 16 I/O61 (io), 17 I/O62 (io), 18 I/O63 (io), 19 Y0 (in), 20 ~{RESET} (in), 21 VCC (power), 22 GOE1 (in), 23 GND (power), 24 ~{isp}~{EN} (in), 25 TDI/IN0 (in), 26 I/O0 (io), 27 I/O1 (io), 28 I/O2 (io), 29 I/O3 (io), 30 I/O4 (io), 31 I/O5 (io), 32 I/O6 (io), 33 I/O7 (io), 34 I/O8 (io), 35 I/O9 (io), 36 I/O10 (io), 37 I/O11 (io), 38 I/O12 (io), 39 I/O13 (io), 40 I/O14 (io), 41 I/O15 (io), 42 VCC (power), 43 TMS/IN1 (in), 44 GND (power), 45 I/O16 (io), 46 I/O17 (io), 47 I/O18 (io), 48 I/O19 (io), 49 I/O20 (io), 50 I/O21 (io), 51 I/O22 (io), 52 I/O23 (io), 53 I/O24 (io), 54 I/O25 (io), 55 I/O26 (io), 56 I/O27 (io), 57 I/O28 (io), 58 I/O29 (io), 59 I/O30 (io), 60 I/O31 (io), 61 TCK/IN3 (in), 62 Y2 (in), 63 GND (power), 64 GOE0 (in), 65 VCC (power), 66 NC, 67 Y1 (in), 68 I/O32 (io), 69 I/O33 (io), 70 I/O34 (io), 71 I/O35 (io), 72 I/O36 (io), 73 I/O37 (io), 74 I/O38 (io), 75 I/O39 (io), 76 I/O40 (io), 77 I/O41 (io), 78 I/O42 (io), 79 I/O43 (io), 80 I/O44 (io), 81 I/O45 (io), 82 I/O46 (io), 83 I/O47 (io), 84 GND (power)

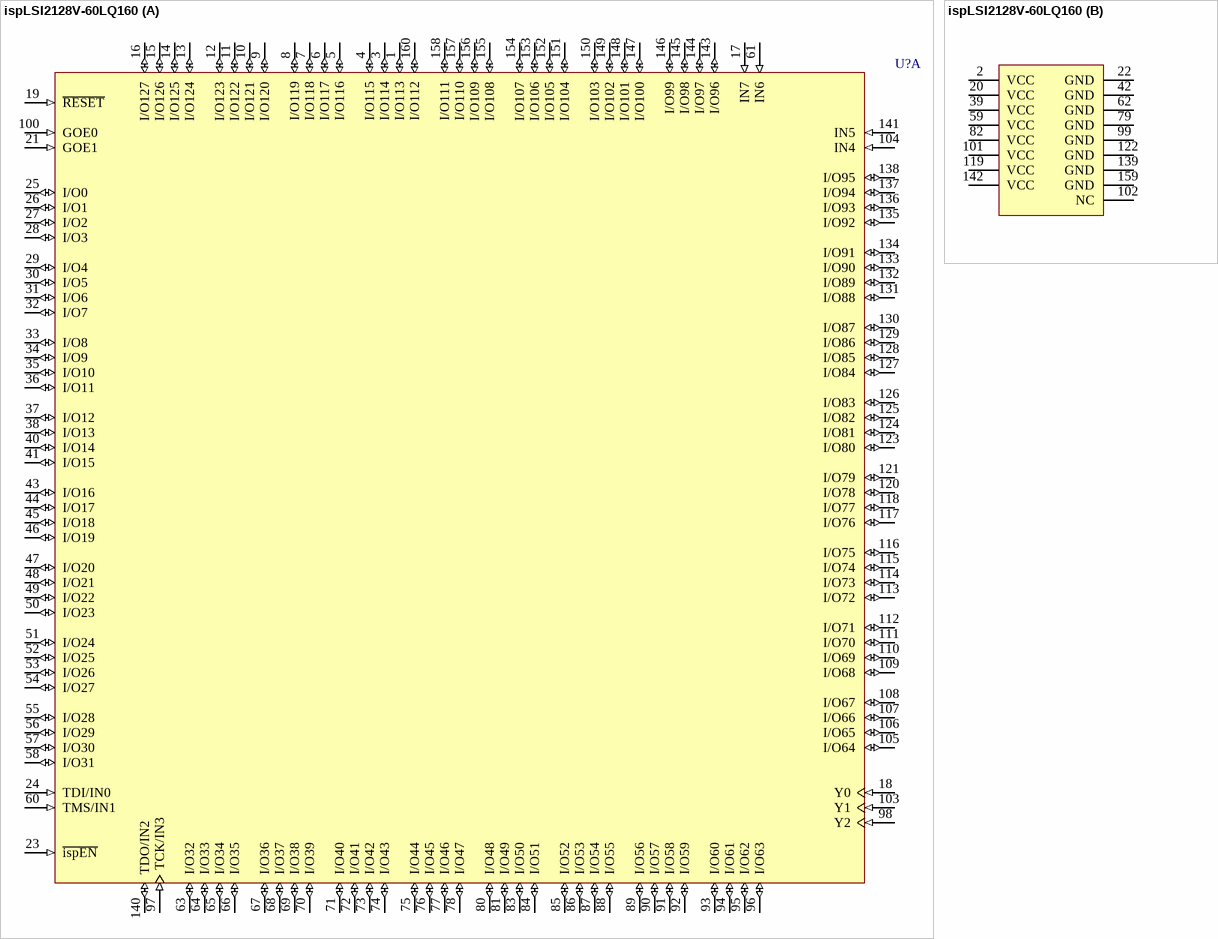
[diagram p87: symbol ispLSI2128V-60LQ160]

## ispLSI2128V-60LQ160
designator U?
3.3V High-Density Programmable Logic; Published: 23-Sep-2002; LatestRevisionDate: 13-Apr-2006; LatestRevisionNote: IPC-7351 Footprint Added.; DatasheetVersion: Feb-2000; PackageVersion: pkg_32, Aug-2005; PackageReference: PQFP160; Publisher: Altium Limited; PackageDescription: 160-Pin Quad Flat Pack 0.65 mm Pitch; Code_IPC: QFP65P3120X3120-160; ComponentLink1Description: Manufacturer Link; ComponentLink1URL: http://www.latticesemi.com/products/mature/index.cfm; ComponentLink2Description: Datasheet; ComponentLink2URL: http://www.latticesemi.com/lit/docs/datasheets/cpld/2128v.pdf
footprint PQFP160_N (QFP, 160-Leads, Body 28 x 28mm, Pitch 0.65mm, IPC Medium Density)
footprint PQFP160_L (QFP, 160-Leads, Body 28 x 28mm, Pitch 0.65mm, IPC High Density)
footprint PQFP160_M (QFP, 160-Leads, Body 28 x 28mm, Pitch 0.65mm, IPC Low Density)
3D model 2128V-PQFP160 (160-Pin Quad Flat Pack 0.65 mm Pitch)
part A pins: 1 I/O113 (io), 3 I/O114 (io), 4 I/O115 (io), 5 I/O116 (io), 6 I/O117 (io), 7 I/O118 (io), 8 I/O119 (io), 9 I/O120 (io), 10 I/O121 (io), 11 I/O122 (io), 12 I/O123 (io), 13 I/O124 (io), 14 I/O125 (io), 15 I/O126 (io), 16 I/O127 (io), 17 IN7 (in), 18 Y0 (in), 19 ~{RESET} (in), 21 GOE1 (in), 23 ~{ispEN} (in), 24 TDI/IN0 (in), 25 I/O0 (io), 26 I/O1 (io), 27 I/O2 (io), 28 I/O3 (io), 29 I/O4 (io), 30 I/O5 (io), 31 I/O6 (io), 32 I/O7 (io), 33 I/O8 (io), 34 I/O9 (io), 35 I/O10 (io), 36 I/O11 (io), 37 I/O12 (io), 38 I/O13 (io), 40 I/O14 (io), 41 I/O15 (io), 43 I/O16 (io), 44 I/O17 (io), 45 I/O18 (io), 46 I/O19 (io), 47 I/O20 (io), 48 I/O21 (io), 49 I/O22 (io), 50 I/O23 (io), 51 I/O24 (io), 52 I/O25 (io), 53 I/O26 (io), 54 I/O27 (io), 55 I/O28 (io), 56 I/O29 (io), 57 I/O30 (io), 58 I/O31 (io), 60 TMS/IN1 (in), 61 IN6 (in), 63 I/O32 (io), 64 I/O33 (io), 65 I/O34 (io), 66 I/O35 (io), 67 I/O36 (io), 68 I/O37 (io), 69 I/O38 (io), 70 I/O39 (io), 71 I/O40 (io), 72 I/O41 (io), 73 I/O42 (io), 74 I/O43 (io), 75 I/O44 (io), 76 I/O45 (io), 77 I/O46 (io), 78 I/O47 (io), 80 I/O48 (io), 81 I/O49 (io), 83 I/O50 (io), 84 I/O51 (io), 85 I/O52 (io), 86 I/O53 (io), 87 I/O54 (io), 88 I/O55 (io), 89 I/O56 (io), 90 I/O57 (io), 91 I/O58 (io), 92 I/O59 (io), 93 I/O60 (io), 94 I/O61 (io), 95 I/O62 (io), 96 I/O63 (io), 97 TCK/IN3 (in), 98 Y2 (in), 100 GOE0 (in), 103 Y1 (in), 104 IN4 (in), 105 I/O64 (io), 106 I/O65 (io), 107 I/O66 (io), 108 I/O67 (io), 109 I/O68 (io), 110 I/O69 (io), 111 I/O70 (io), 112 I/O71 (io), 113 I/O72 (io), 114 I/O73 (io), 115 I/O74 (io), 116 I/O75 (io), 117 I/O76 (io), 118 I/O77 (io), 120 I/O78 (io), 121 I/O79 (io), 123 I/O80 (io), 124 I/O81 (io), 125 I/O82 (io), 126 I/O83 (io), 127 I/O84 (io), 128 I/O85 (io), 129 I/O86 (io), 130 I/O87 (io), 131 I/O88 (io), 132 I/O89 (io), 133 I/O90 (io), 134 I/O91 (io), 135 I/O92 (io), 136 I/O93 (io), 137 I/O94 (io), 138 I/O95 (io), 140 TDO/IN2 (io), 141 IN5 (in), 143 I/O96 (io), 144 I/O97 (io), 145 I/O98 (io), 146 I/O99 (io), 147 I/O100 (io), 148 I/O101 (io), 149 I/O102 (io), 150 I/O103 (io), 151 I/O104 (io), 152 I/O105 (io), 153 I/O106 (io), 154 I/O107 (io), 155 I/O108 (io), 156 I/O109 (io), 157 I/O110 (io), 158 I/O111 (io), 160 I/O112 (io)
part B pins: 2 VCC (power), 20 VCC (power), 22 GND (power), 39 VCC (power), 42 GND (power), 59 VCC (power), 62 GND (power), 79 GND (power), 82 VCC (power), 99 GND (power), 101 VCC (power), 102 NC, 119 VCC (power), 122 GND (power), 139 GND (power), 142 VCC (power), 159 GND (power)

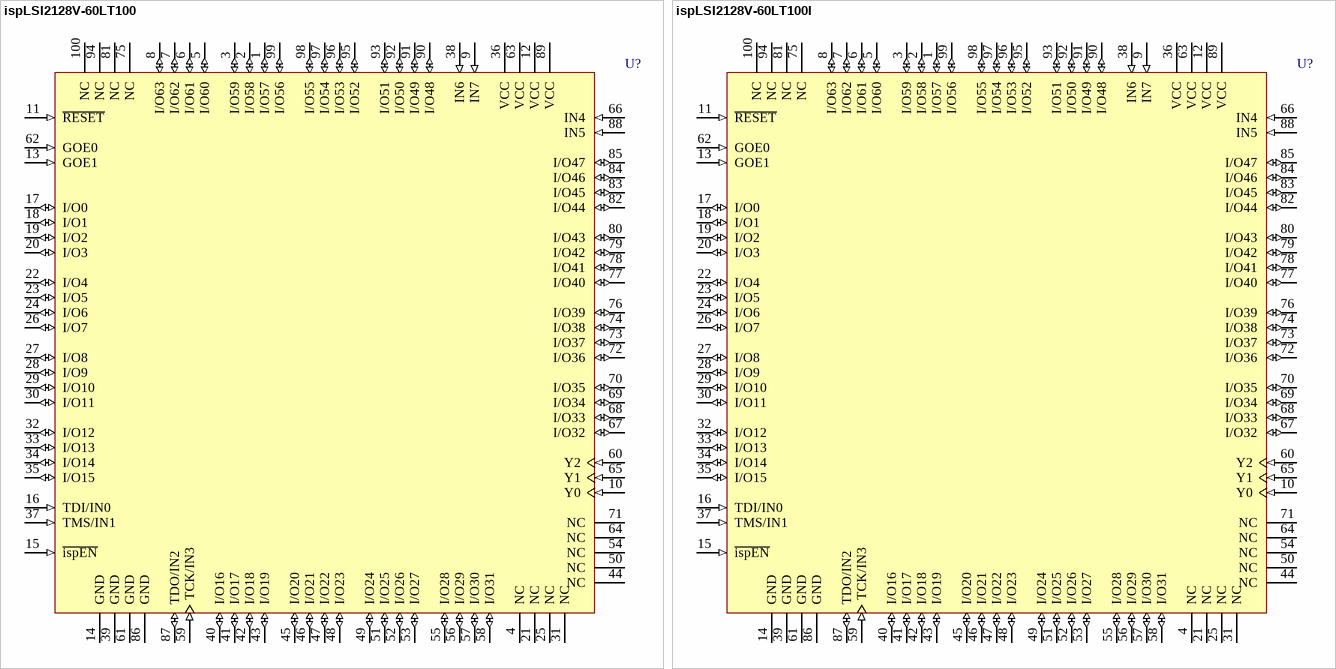
[diagram p88: symbols ispLSI2128V-60LT100 to ispLSI2128V-60LT100I]

## ispLSI2128V-60LT100
designator U?
3.3V High-Density Programmable Logic; Published: 23-Sep-2002; LatestRevisionDate: 13-Apr-2006; LatestRevisionNote: IPC-7351 Footprint Added.; DatasheetVersion: Feb-2000; PackageVersion: pkg_32, Aug-2005; PackageReference: TQFP100; Publisher: Altium Limited; PackageDescription: 100-Pin Thin Quad Flat Pack (TQFP100); Code_JEDEC: MS-026-BED; ComponentLink1Description: Manufacturer Link; ComponentLink1URL: http://www.latticesemi.com/products/mature/index.cfm; ComponentLink2Description: Datasheet; ComponentLink2URL: http://www.latticesemi.com/lit/docs/datasheets/cpld/2128v.pdf
footprint TQFP100_N (Thin QFP, 100-Leads, Body 14x14mm, Pitch 0.5mm, IPC Medium Density)
footprint TQFP100_L (Thin QFP, 100-Leads, Body 14x14mm, Pitch 0.5mm, IPC High Density)
footprint TQFP100_M (Thin QFP, 100-Leads, Body 14x14mm, Pitch 0.5mm, IPC Low Density)
3D model 2128V-TQFP100 (100-Pin Thin Quad Flat Pack (TQFP100))
pins: 1 I/O57 (io), 2 I/O58 (io), 3 I/O59 (io), 4 NC, 5 I/O60 (io), 6 I/O61 (io), 7 I/O62 (io), 8 I/O63 (io), 9 IN7 (in), 10 Y0 (in), 11 ~{RESET} (in), 12 VCC (power), 13 GOE1 (in), 14 GND (power), 15 ~{ispEN} (in), 16 TDI/IN0 (in), 17 I/O0 (io), 18 I/O1 (io), 19 I/O2 (io), 20 I/O3 (io), 21 NC, 22 I/O4 (io), 23 I/O5 (io), 24 I/O6 (io), 25 NC, 26 I/O7 (io), 27 I/O8 (io), 28 I/O9 (io), 29 I/O10 (io), 30 I/O11 (io), 31 NC, 32 I/O12 (io), 33 I/O13 (io), 34 I/O14 (io), 35 I/O15 (io), 36 VCC (power), 37 TMS/IN1 (in), 38 IN6 (in), 39 GND (power), 40 I/O16 (io), 41 I/O17 (io), 42 I/O18 (io), 43 I/O19 (io), 44 NC, 45 I/O20 (io), 46 I/O21 (io), 47 I/O22 (io), 48 I/O23 (io), 49 I/O24 (io), 50 NC, 51 I/O25 (io), 52 I/O26 (io), 53 I/O27 (io), 54 NC, 55 I/O28 (io), 56 I/O29 (io), 57 I/O30 (io), 58 I/O31 (io), 59 TCK/IN3 (in), 60 Y2 (in), 61 GND (power), 62 GOE0 (in), 63 VCC (power), 64 NC, 65 Y1 (in), 66 IN4 (in), 67 I/O32 (io), 68 I/O33 (io), 69 I/O34 (io), 70 I/O35 (io), 71 NC, 72 I/O36 (io), 73 I/O37 (io), 74 I/O38 (io), 75 NC, 76 I/O39 (io), 77 I/O40 (io), 78 I/O41 (io), 79 I/O42 (io), 80 I/O43 (io), 81 NC, 82 I/O44 (io), 83 I/O45 (io), 84 I/O46 (io), 85 I/O47 (io), 86 GND (power), 87 TDO/IN2 (io), 88 IN5 (in), 89 VCC (power), 90 I/O48 (io), 91 I/O49 (io), 92 I/O50 (io), 93 I/O51 (io), 94 NC, 95 I/O52 (io), 96 I/O53 (io), 97 I/O54 (io), 98 I/O55 (io), 99 I/O56 (io), 100 NC